# Altium footprint library 4.03-1.27mm排针-排母.PcbLib: 22 footprints (part 2 of 2)
Each footprint in its own frame and in the unit in brackets; x right, y up, seen from the top. Pads: shape width x height; smd on the part's side, far side on the other; paste and mask are expansions set on the pad; w line width, h text height; cw(c..) or ccw(c..) is an arc to the next point about the centre after c.
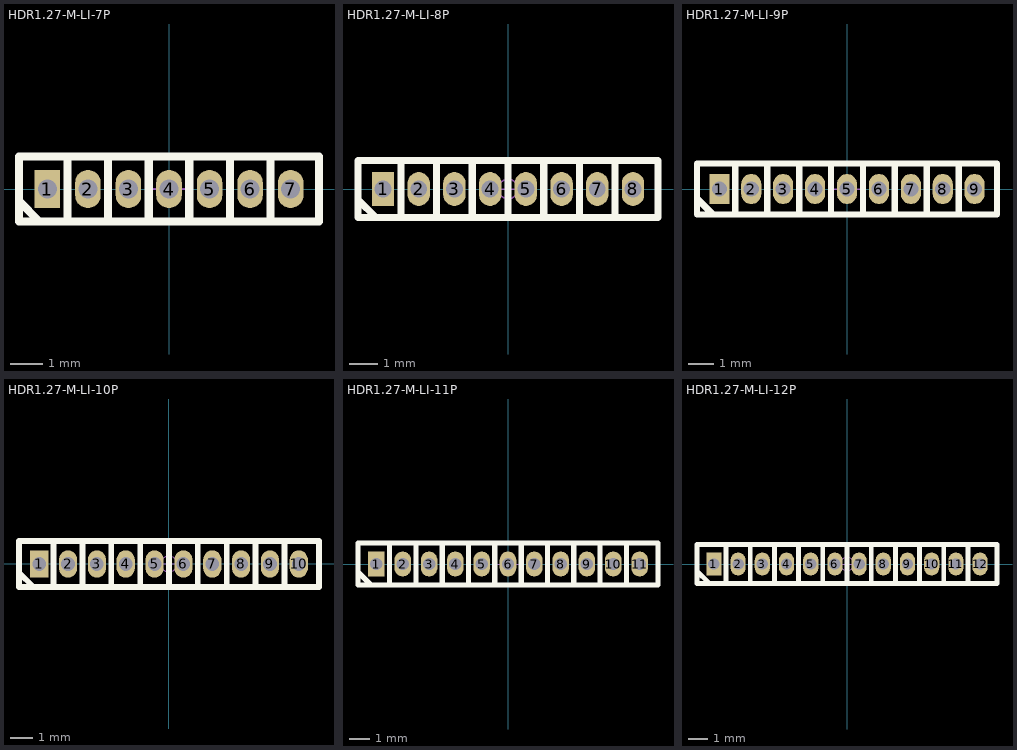
[diagram p1: the footprints below, top view; thin cyan lines are the x and y axes]

## HDR1.27-M-LI-7P [mm] "直插，脚距：1.27mm        封装库来自淘宝卖家 ID：黄晶宝石"
pads (7):
  rect 0.8x1.2 hole 0.6: 1(-3.81,0)
  oval 0.8x1.2 hole 0.6: 2(-2.54,0) 3(-1.27,0) 4(0,0) 5(1.27,0) 6(2.54,0) 7(3.81,0)
Top Overlay:
  lines w0.254: -4.699,-0.254 -4.699,-0.381 -4.064,-1.016 ; -3.175,-1.016 -3.175,1.016 ; -1.905,-1.016 -1.905,1.016 ; -0.635,-1.016 -0.635,1.016 ; 0.635,-1.016 0.635,1.016 ; 1.905,-1.016 1.905,1.016 ; 3.175,-1.016 3.175,1.016 ; -4.699,-1.016 -4.699,1.016 4.699,1.016 4.699,-1.016 -4.699,-1.016
Mechanical 15:
  circle w0.05: c0,0 r0.35
  lines w0.05: -0.5,0 0.5,0 ; 0,-0.5 0,0.5
3D body "HDR1.27-M-LI-7P.STEP": height 4.5, standoff -2.1, extent -4.61,-0.9 4.61,0.9

## HDR1.27-M-LI-8P [mm] "直插，脚距：1.27mm   封装库来自淘宝卖家 ID：黄晶宝石"
pads (8):
  rect 0.8x1.2 hole 0.6: 1(-4.445,0)
  oval 0.8x1.2 hole 0.6: 2(-3.175,0) 3(-1.905,0) 4(-0.635,0) 5(0.635,0) 6(1.905,0) 7(3.175,0) 8(4.445,0)
Top Overlay:
  lines w0.254: -5.334,-0.254 -5.334,-0.381 -4.699,-1.016 ; -3.81,-1.016 -3.81,1.016 ; -2.54,-1.016 -2.54,1.016 ; -1.27,-1.016 -1.27,1.016 ; 0,-1.016 0,1.016 ; 1.27,-1.016 1.27,1.016 ; 2.54,-1.016 2.54,1.016 ; 3.81,-1.016 3.81,1.016 ; -5.334,-1.016 5.334,-1.016 5.334,1.016 -5.334,1.016 -5.334,-1.016
Mechanical 15:
  circle w0.05: c0,0 r0.35
  lines w0.05: -0.5,0 0.5,0 ; 0,-0.5 0,0.5
3D body "HDR1.27-M-LI-8P.STEP": height 4.5, standoff -2.1, extent -5.245,-0.9 5.245,0.9

## HDR1.27-M-LI-9P [mm] "直插，脚距：1.27mm"
pads (9):
  rect 0.8x1.2 hole 0.6: 1(-5.08,0)
  oval 0.8x1.2 hole 0.6: 2(-3.81,0) 3(-2.54,0) 4(-1.27,0) 5(0,0) 6(1.27,0) 7(2.54,0) 8(3.81,0) 9(5.08,0)
Top Overlay:
  lines w0.254: -5.969,-0.254 -5.969,-0.381 -5.334,-1.016 ; -4.445,-1.016 -4.445,1.016 ; -3.175,-1.016 -3.175,1.016 ; -1.905,-1.016 -1.905,1.016 ; -0.635,-1.016 -0.635,1.016 ; 0.635,-1.016 0.635,1.016 ; 1.905,-1.016 1.905,1.016 ; 3.175,-1.016 3.175,1.016 ; 4.445,-1.016 4.445,1.016 ; -5.969,-1.016 -5.969,1.016 5.969,1.016 5.969,-1.016 -5.969,-1.016
Mechanical 15:
  circle w0.05: c0,0 r0.35
  lines w0.05: -0.5,0 0.5,0 ; 0,-0.5 0,0.5
3D body "HDR1.27-M-LI-9P.STEP": height 4.5, standoff -2.1, extent -5.88,-0.9 5.88,0.9

## HDR1.27-M-LI-10P [mm] "直插，脚距：1.27mm"
pads (10):
  rect 0.8x1.2 hole 0.6: 1(-5.715,0)
  oval 0.8x1.2 hole 0.6: 2(-4.445,0) 3(-3.175,0) 4(-1.905,0) 5(-0.635,0) 6(0.635,0) 7(1.905,0) 8(3.175,0) 9(4.445,0) 10(5.715,0)
Top Overlay:
  lines w0.254: -6.604,-0.254 -6.604,-0.381 -5.969,-1.016 ; -5.08,-1.016 -5.08,1.016 ; -3.81,-1.016 -3.81,1.016 ; -2.54,-1.016 -2.54,1.016 ; -1.27,-1.016 -1.27,1.016 ; 0,-1.016 0,1.016 ; 1.27,-1.016 1.27,1.016 ; 2.54,-1.016 2.54,1.016 ; 3.81,-1.016 3.81,1.016 ; 5.08,-1.016 5.08,1.016 ; -6.604,-1.016 6.604,-1.016 6.604,1.016 -6.604,1.016 -6.604,-1.016
Mechanical 15:
  circle w0.05: c0,0 r0.35
  lines w0.05: -0.5,0 0.5,0 ; 0,-0.5 0,0.5
3D body "HDR1.27-M-LI-10P.STEP": height 4.5, standoff -2.1, extent -6.515,-0.9 6.515,0.9

## HDR1.27-M-LI-11P [mm] "直插，脚距：1.27mm封装库来自淘宝卖家 ID：黄晶宝石"
pads (11):
  rect 0.8x1.2 hole 0.6: 1(-6.35,0)
  oval 0.8x1.2 hole 0.6: 2(-5.08,0) 3(-3.81,0) 4(-2.54,0) 5(-1.27,0) 6(0,0) 7(1.27,0) 8(2.54,0) 9(3.81,0) 10(5.08,0) 11(6.35,0)
Top Overlay:
  lines w0.254: -7.239,-0.254 -7.239,-0.381 -6.604,-1.016 ; -5.715,-1.016 -5.715,1.016 ; -4.445,-1.016 -4.445,1.016 ; -3.175,-1.016 -3.175,1.016 ; -1.905,-1.016 -1.905,1.016 ; -0.635,-1.016 -0.635,1.016 ; 0.635,-1.016 0.635,1.016 ; 1.905,-1.016 1.905,1.016 ; 3.175,-1.016 3.175,1.016 ; 4.445,-1.016 4.445,1.016 ; 5.715,-1.016 5.715,1.016 ; -7.239,-1.016 -7.239,1.016 7.239,1.016 7.239,-1.016 -7.239,-1.016
Mechanical 15:
  circle w0.05: c0,0 r0.35
  lines w0.05: -0.5,0 0.5,0 ; 0,-0.5 0,0.5
3D body "HDR1.27-M-LI-11P.STEP": height 1.7, standoff -4.9, extent -7.15,-0.9 7.15,0.9

## HDR1.27-M-LI-12P [mm] "直插，脚距：1.27mm封装库来自淘宝卖家 ID：黄晶宝石"
pads (12):
  rect 0.8x1.2 hole 0.6: 1(-6.985,0)
  oval 0.8x1.2 hole 0.6: 2(-5.715,0) 3(-4.445,0) 4(-3.175,0) 5(-1.905,0) 6(-0.635,0) 7(0.635,0) 8(1.905,0) 9(3.175,0) 10(4.445,0) 11(5.715,0) 12(6.985,0)
Top Overlay:
  lines w0.254: -7.874,-0.254 -7.874,-0.381 -7.239,-1.016 ; -6.35,-1.016 -6.35,1.016 ; -5.08,-1.016 -5.08,1.016 ; -3.81,-1.016 -3.81,1.016 ; -2.54,-1.016 -2.54,1.016 ; -1.27,-1.016 -1.27,1.016 ; 0,-1.016 0,1.016 ; 1.27,-1.016 1.27,1.016 ; 2.54,-1.016 2.54,1.016 ; 3.81,-1.016 3.81,1.016 ; 5.08,-1.016 5.08,1.016 ; 6.35,-1.016 6.35,1.016 ; -7.874,-1.016 7.874,-1.016 7.874,1.016 -7.874,1.016 -7.874,-1.016
Mechanical 15:
  circle w0.05: c0,0 r0.35
  lines w0.05: -0.5,0 0.5,0 ; 0,-0.5 0,0.5
3D body "HDR1.27-M-LI-12P.STEP": height 1.7, standoff -4.9, extent -7.785,-0.9 7.785,0.9